# Altium footprint library Altium_Lib.PcbLib: 334 footprints (part 8 of 21)
Each footprint in its own frame and in the unit in brackets; x right, y up, seen from the top. Pads: shape width x height; smd on the part's side, far side on the other; paste and mask are expansions set on the pad; w line width, h text height; cw(c..) or ccw(c..) is an arc to the next point about the centre after c.
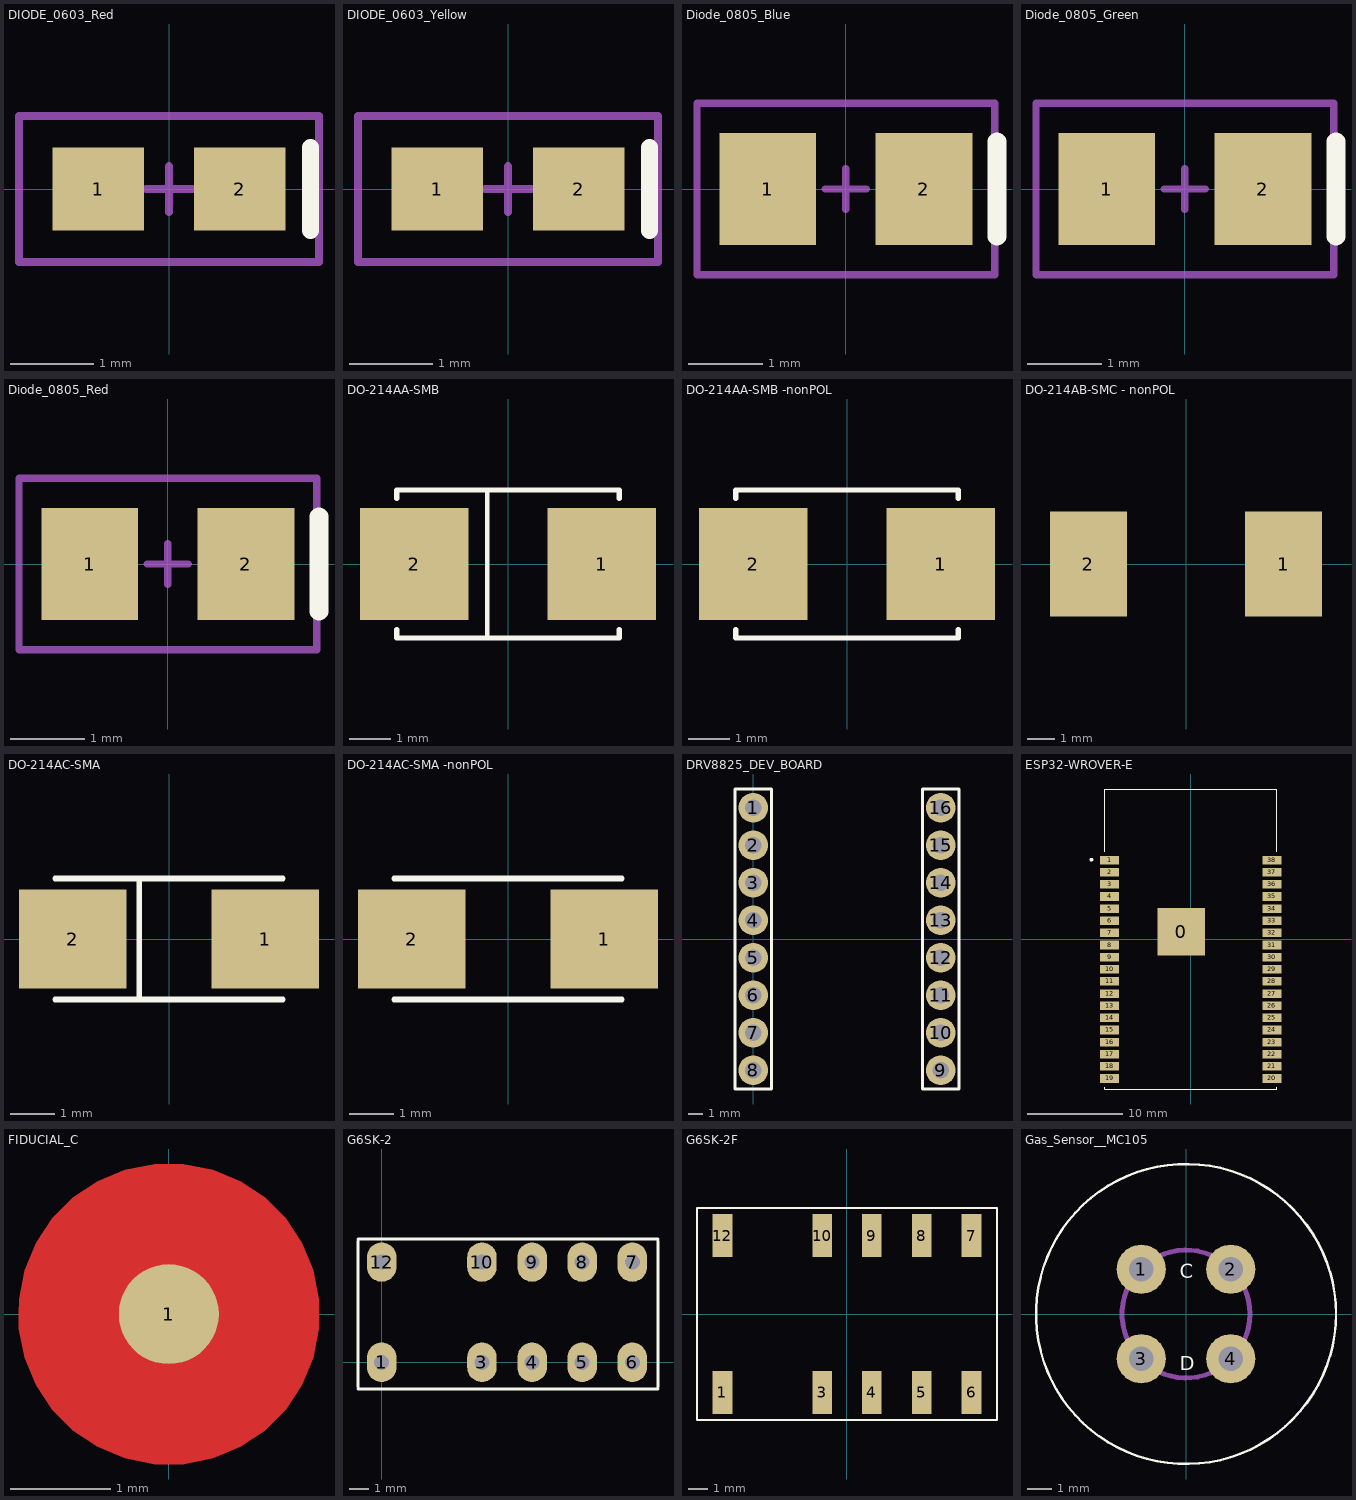
[diagram p7: the footprints below, top view; thin cyan lines are the x and y axes]

## DIODE_0603_Red [mm] "Chip Resistor; Body 1.6 x 0.8 mm (LxW typ)"
height 0.85
pads (2):
  rect 1.1x1 smd: 1(-0.85,0) 2(0.85,0)
Top Overlay:
  lines w0.203: 1.7,-0.5 1.7,0.5
Mechanical 15:
  lines w0.1: -0.275,0 0.275,0 ; 0,-0.275 0,0.275 ; -1.8,-0.875 1.8,-0.875 1.8,0.875 -1.8,0.875 -1.8,-0.875
3D body "LED_0603_Red.step": height 0.6, standoff 0, extent -0.81,-0.4 0.81,0.4

## DIODE_0603_Yellow [mm] "Chip Resistor; Body 1.6 x 0.8 mm (LxW typ)"
height 0.85
pads (2):
  rect 1.1x1 smd: 1(-0.85,0) 2(0.85,0)
Top Overlay:
  lines w0.203: 1.7,-0.5 1.7,0.5
Mechanical 15:
  lines w0.1: -0.275,0 0.275,0 ; 0,-0.275 0,0.275 ; -1.8,-0.875 1.8,-0.875 1.8,0.875 -1.8,0.875 -1.8,-0.875
3D body "LED_0603_Yellow.step": height 0.6, standoff 0, extent -0.81,-0.4 0.81,0.4

## Diode_0805_Blue [mm]
height 2
pads (2):
  rect 1.3x1.5 smd: 1(-1.05,0) 2(1.05,0)
Top Overlay:
  lines w0.254: 2.032,-0.635 2.032,0.635
Mechanical 15:
  lines w0.1: -0.275,0 0.275,0 ; 0,-0.275 0,0.275 ; -2,-1.15 -2,1.15 2,1.15 2,-1.15 -2,-1.15
3D body "LED_0805_Blue.step": height 1.1, standoff 0, extent -1.01,-0.625 1.01,0.625

## Diode_0805_Green [mm]
height 2
pads (2):
  rect 1.3x1.5 smd: 1(-1.05,0) 2(1.05,0)
Top Overlay:
  lines w0.254: 2.032,-0.635 2.032,0.635
Mechanical 15:
  lines w0.1: -0.275,0 0.275,0 ; 0,-0.275 0,0.275 ; -2,-1.15 2,-1.15 2,1.15 -2,1.15 -2,-1.15
3D body "LED_0805_Green.step": height 1.1, standoff 0, extent -1.01,-0.625 1.01,0.625

## Diode_0805_Red [mm]
height 2
pads (2):
  rect 1.3x1.5 smd: 1(-1.05,0) 2(1.05,0)
Top Overlay:
  lines w0.254: 2.032,-0.635 2.032,0.635
Mechanical 15:
  lines w0.1: -0.275,0 0.275,0 ; 0,-0.275 0,0.275 ; -2,-1.15 -2,1.15 2,1.15 2,-1.15 -2,-1.15
3D body "LED_0805_Red.step": height 1.1, standoff 0, extent -1.01,-0.625 1.01,0.625

## DO-214AA-SMB [mm]
height 2.642
pads (2):
  rect 2.6x2.7 smd: 1(2.25,0) 2(-2.25,0)
Top Overlay:
  lines w0.1: -0.5,-1.778 -0.5,1.778
  lines w0.127: -2.667,-1.575 -2.667,-1.778 2.667,-1.778 2.667,-1.575 ; -2.667,1.575 -2.667,1.778 2.667,1.778 2.667,1.575
3D body "User Library-DO-214AA(SMB).STEP": height 1.3, standoff -1.35, extent -2.794,-1.975 2.794,1.975

## DO-214AA-SMB -nonPOL [mm]
height 2.642
pads (2):
  rect 2.6x2.7 smd: 1(2.25,0) 2(-2.25,0)
Top Overlay:
  lines w0.127: -2.667,-1.575 -2.667,-1.778 2.667,-1.778 2.667,-1.575 ; -2.667,1.575 -2.667,1.778 2.667,1.778 2.667,1.575
3D body "DO_214AA_SMB_nonPOL.STEP": height 2.35, standoff 0.05, extent -2.7,-1.8 2.7,1.8

## DO-214AB-SMC - nonPOL [mm]
height 2.642
pads (2):
  rect 2.8x3.8 smd: 1(3.55,0) 2(-3.55,0)
3D body "DO_214AC_SMA_nonPOL.STEP": height 2.35, standoff 0.05, extent -3.975,-2.95 3.975,2.95

## DO-214AC-SMA [mm]
height 4
pads (2):
  rect 2.4x2.2 smd: 1(2.15,0) 2(-2.15,0)
Top Overlay:
  lines w0.127: -2.54,-1.35 2.54,-1.35 ; -2.54,1.35 2.54,1.35 ; -0.662,-1.35 -0.662,1.35
3D body "DO_214AC_SMA.STEP": height 2.4, standoff 0, extent -2.6,-1.3 2.6,1.3

## DO-214AC-SMA -nonPOL [mm]
height 4
pads (2):
  rect 2.4x2.2 smd: 1(2.15,0) 2(-2.15,0)
Top Overlay:
  lines w0.127: -2.54,-1.35 2.54,-1.35 ; -2.54,1.35 2.54,1.35
3D body: height 2.36, standoff 2.34, extent -2.01,-1.16 2.01,1.16
3D body "DO_214AC_SMA.STEP": height 2.35, standoff -0.05, extent -2.6,-1.3 2.6,1.3

## DRV8825_DEV_BOARD [mm]
pads (16):
  round 2 hole 1.1: 1(0,8.89) 2(0,6.35) 3(0,3.81) 4(0,1.27) 5(0,-1.27) 6(0,-3.81) 7(0,-6.35) 8(0,-8.89) 9(12.7,-8.89) 10(12.7,-6.35) 11(12.7,-3.81) 12(12.7,-1.27) 13(12.7,1.27) 14(12.7,3.81) 15(12.7,6.35) 16(12.7,8.89)
Top Overlay:
  lines w0.2: -1.25,-10.16 1.25,-10.16 1.25,10.16 -1.25,10.16 -1.25,-10.16 ; 11.45,-10.16 11.45,10.16 13.95,10.16 13.95,-10.16 11.45,-10.16
3D body "User Library-Header _Fem_1X8.STEP": height 8.5, standoff -3.2, extent -1.27,-10.41 1.27,10.41
3D body "User Library-Header _Fem_1X8.STEP": height 8.5, standoff -3.2, extent 11.43,-10.41 13.97,10.41
3D body "User Library-A4988.STEP": height 14.04, standoff 3.88, extent -1.27,-10.16 13.97,10.16

## ESP32-WROVER-E [mm]
pads (39):
  rect 5x5 smd paste-3 mask+0: 0(-1,0.76)
  rect 2x0.9 smd: 1(-8.5,8.26) 2(-8.5,6.99) 3(-8.5,5.72) 4(-8.5,4.45) 5(-8.5,3.18) 6(-8.5,1.91) 7(-8.5,0.64) 8(-8.5,-0.63) 9(-8.5,-1.9) 10(-8.5,-3.17) 11(-8.5,-4.44) 12(-8.5,-5.71) 13(-8.5,-6.98) 14(-8.5,-8.25) 15(-8.5,-9.52) 16(-8.5,-10.79) 17(-8.5,-12.06) 18(-8.5,-13.33) 19(-8.5,-14.6) 20(8.5,-14.6) 21(8.5,-13.33) 22(8.5,-12.06) 23(8.5,-10.79) 24(8.5,-9.52) 25(8.5,-8.25) 26(8.5,-6.98) 27(8.5,-5.71) 28(8.5,-4.44) 29(8.5,-3.17) 30(8.5,-1.9) 31(8.5,-0.63) 32(8.5,0.64) 33(8.5,1.91) 34(8.5,3.18) 35(8.5,4.45) 36(8.5,5.72) 37(8.5,6.99) 38(8.5,8.26)
Top Overlay:
  circle w0.2: c-10.4,8.3 r0.1
  lines w0.127: -9,-15.5 -9,-15.7 9,-15.7 9,-15.5 ; -9,9.13 -9,15.7 9,15.7 9,9.13
Top Paste:
  region: 1.5,-1.74 0.17,-1.74 0.17,-0.41 1.5,-0.41
  region: -0.335,-1.74 -1.665,-1.74 -1.665,-0.41 -0.335,-0.41
  region: -2.17,-1.74 -3.5,-1.74 -3.5,-0.41 -2.17,-0.41
  region: -2.17,1.93 -3.5,1.93 -3.5,3.26 -2.17,3.26
  region: -0.335,1.93 -1.665,1.93 -1.665,3.26 -0.335,3.26
  region: 1.5,1.93 0.17,1.93 0.17,3.26 1.5,3.26
  region: 1.5,0.095 0.17,0.095 0.17,1.425 1.5,1.425
  region: -2.17,0.095 -3.5,0.095 -3.5,1.425 -2.17,1.425
  region: -0.335,0.095 -1.665,0.095 -1.665,1.425 -0.335,1.425
Top Solder:
  region: 1.5,-1.74 0.17,-1.74 0.17,-0.41 1.5,-0.41
  region: -0.335,-1.74 -1.665,-1.74 -1.665,-0.41 -0.335,-0.41
  region: -2.17,-1.74 -3.5,-1.74 -3.5,-0.41 -2.17,-0.41
  region: -2.17,1.93 -3.5,1.93 -3.5,3.26 -2.17,3.26
  region: -0.335,1.93 -1.665,1.93 -1.665,3.26 -0.335,3.26
  region: 1.5,1.93 0.17,1.93 0.17,3.26 1.5,3.26
  region: 1.5,0.095 0.17,0.095 0.17,1.425 1.5,1.425
  region: -2.17,0.095 -3.5,0.095 -3.5,1.425 -2.17,1.425
  region: -0.335,0.095 -1.665,0.095 -1.665,1.425 -0.335,1.425
3D body "ESP32-WROVER-B.STEP": height 3.3, standoff 0, extent -9,-16.2 9,15.2

## FIDUCIAL_C [mm]
pads (1):
  rrect100% 1x1 smd: 1(0,0)
Top Layer:
  pour cut-out: 0.002,-1.499 -0.145,-1.499 -0.435,-1.441 -0.708,-1.328 -0.954,-1.164 -1.163,-0.955 -1.327,-0.71 -1.44,-0.437 -1.498,-0.147 -1.498,0.001 -1.498,0.149 -1.44,0.439 -1.327,0.712 -1.163,0.957 -0.954,1.166 -0.708,1.33 -0.435,1.443 -0.145,1.501 0.002,1.501 0.15,1.501 0.44,1.443 0.713,1.33 0.959,1.166 1.168,0.957 1.332,0.712 1.445,0.439 1.502,0.149 1.502,0.001 1.502,-0.147 1.445,-0.437 1.332,-0.71 1.168,-0.955 0.959,-1.164 0.713,-1.328 0.44,-1.441 0.15,-1.499
Top Solder:
  circle w1.5: c0,0 r0.75

## G6SK-2 [mm]
pads (10):
  oval 1.5x2 hole 0.762: 1(0,0) 3(5.08,0) 4(7.62,0) 5(10.16,0) 6(12.7,0) 7(12.7,5.08) 8(10.16,5.08) 9(7.62,5.08) 10(5.08,5.08) 12(0,5.08)
Top Overlay:
  lines w0.15: -1.2,-1.35 14,-1.35 ; -1.2,-1.25 -1.2,6.15 ; -1.2,6.25 14,6.25 ; 14,-1.25 14,6.15
3D body "G6SK_2.step": height 9.2, standoff -2.95, extent -1.04,-1.18 13.76,6.12

## G6SK-2F [mm]
pads (10):
  rect 1x2.2 smd: 1(-6.35,-4) 3(-1.27,-4) 4(1.27,-4) 5(3.81,-4) 6(6.35,-4) 7(6.35,4) 8(3.81,4) 9(1.27,4) 10(-1.27,4) 12(-6.35,4)
Top Overlay:
  lines w0.1: -7.65,-5.4 7.65,-5.4 7.65,5.4 -7.65,5.4 -7.65,-5.4
3D body "G6SK_2F.step": height 9.2, standoff 0, extent -7.42,-4.6 7.38,4.6

## Gas_Sensor__MC105 [mm]
height 8.8
pads (4):
  round 2 hole 1 unplated: 1(-1.82,1.82) 2(1.82,1.82) 3(-1.82,-1.82) 4(1.82,-1.82)
Top Overlay:
  circle w0.1: c0,0 r6.1
  text "C" at -0.25,1.25 h1
  text "D" at -0.25,-2.5 h1
Mechanical 13:
  circle w0.2: c0,0 r2.6
Mechanical 15:
  circle w0.2: c-1.82,1.82 r0.453
  circle w0.2: c1.82,1.82 r0.367
  circle w0.2: c1.82,-1.82 r0.436
  circle w0.2: c-1.82,-1.82 r0.536
3D body: height 8.8, standoff 0, extent -6.099,-6.099 6.099,6.099
3D body: height 3, standoff 0, extent -2.272,1.368 -1.368,2.272
3D body: height 3, standoff 0, extent 1.385,-2.255 2.255,-1.385
3D body: height 3, standoff 0, extent -2.355,-2.355 -1.285,-1.285
3D body: height 3, standoff 0, extent 1.453,1.453 2.187,2.187
3D body: height 9.2, standoff 0, extent -2.599,-2.599 2.599,2.599
3D body: height 9.1, standoff 0, extent -2.599,-2.599 2.599,2.599